# Altium footprint library My Footprint.PcbLib: 268 footprints (part 13 of 17)
Each footprint in its own frame and in the unit in brackets; x right, y up, seen from the top. Pads: shape width x height; smd on the part's side, far side on the other; paste and mask are expansions set on the pad; w line width, h text height; cw(c..) or ccw(c..) is an arc to the next point about the centre after c.
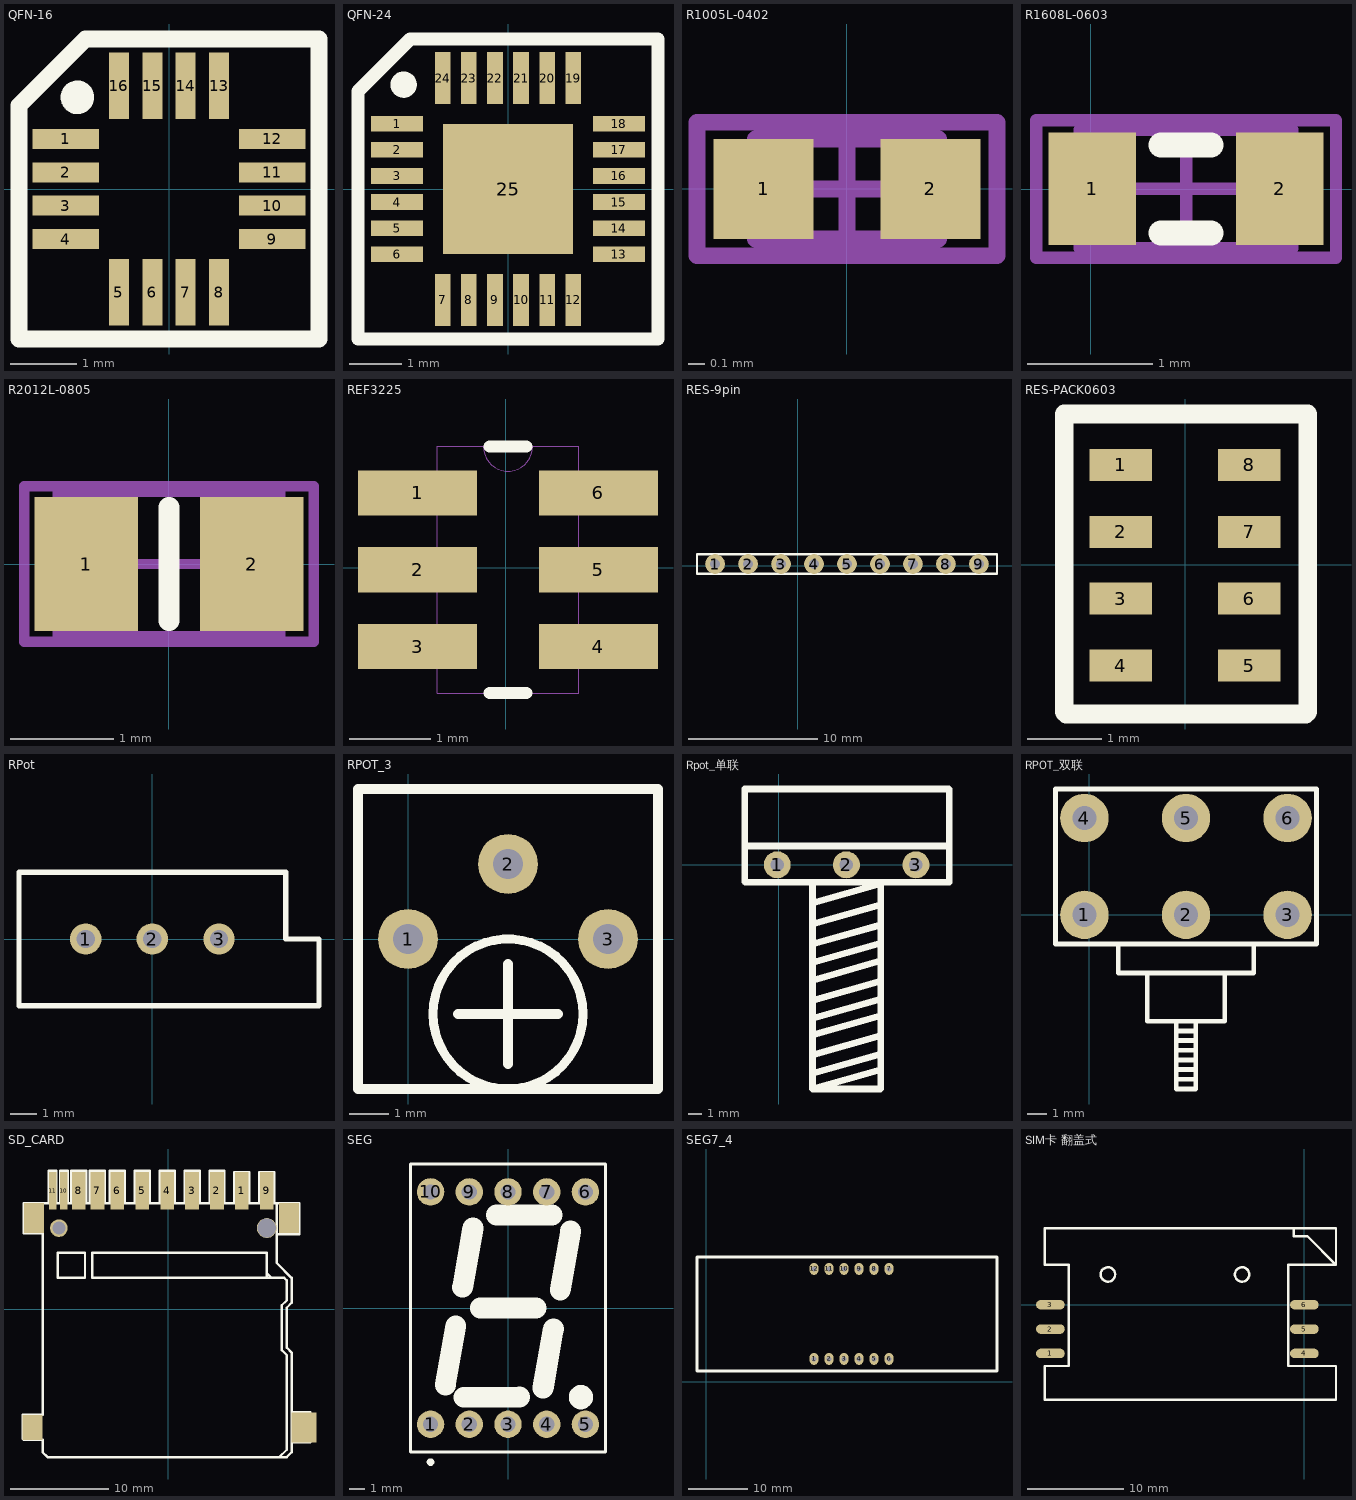
[diagram p12: the footprints below, top view; thin cyan lines are the x and y axes]

## QFN-16 [mm]
height 0.9
pads (16):
  rect 1x0.3 smd: 1(-1.55,0.75) 2(-1.55,0.25) 3(-1.55,-0.25) 4(-1.55,-0.75) 9(1.55,-0.75) 10(1.55,-0.25) 11(1.55,0.25) 12(1.55,0.75)
  rect 0.3x1 smd: 5(-0.75,-1.55) 6(-0.25,-1.55) 7(0.25,-1.55) 8(0.75,-1.55) 13(0.75,1.55) 14(0.25,1.55) 15(-0.25,1.55) 16(-0.75,1.55)
Top Overlay:
  circle w0.254: c-1.375,1.375 r0.125
  lines w0.254: -2.25,-2.25 -2.25,1.25 -1.25,2.25 2.25,2.25 2.25,-2.25 -2.25,-2.25
3D body "User Library-qfn16-3x3.step": height 0.92, standoff 0, extent -1.5,-1.5 1.5,1.5

## QFN-24 [mm]
pads (25):
  rect 1x0.3 smd: 1(-2.125,1.25) 2(-2.125,0.75) 3(-2.125,0.25) 4(-2.125,-0.25) 5(-2.125,-0.75) 6(-2.125,-1.25) 13(2.125,-1.25) 14(2.125,-0.75) 15(2.125,-0.25) 16(2.125,0.25) 17(2.125,0.75) 18(2.125,1.25)
  rect 0.3x1 smd: 7(-1.25,-2.125) 8(-0.75,-2.125) 9(-0.25,-2.125) 10(0.25,-2.125) 11(0.75,-2.125) 12(1.25,-2.125) 19(1.25,2.125) 20(0.75,2.125) 21(0.25,2.125) 22(-0.25,2.125) 23(-0.75,2.125) 24(-1.25,2.125)
  rect 2.5x2.5 smd: 25(0,0)
Top Overlay:
  circle w0.254: c-2,2 r0.125
  lines w0.254: -2.875,-2.875 2.875,-2.875 2.875,2.875 -1.25,2.875 -1.875,2.875 -2.875,1.875 -2.875,1.25 -2.875,-2.875
3D body "User Library-QFN 24 4x4.step": height 0.9, standoff 0, extent -2.002,-2.002 2.002,2.002

## R1005L-0402 [mm]
pads (2):
  rect 0.6x0.6 smd: 1(-0.5,0) 2(0.5,0)
Mechanical 13:
  lines w0.1: -0.55,-0.3 -0.55,0.3 0.55,0.3 0.55,-0.3 -0.55,-0.3
Mechanical 15:
  lines w0.1: -0.3,0 0.3,0 ; 0,-0.3 0,0.3 ; -0.9,-0.4 -0.9,0.4 0.9,0.4 0.9,-0.4 -0.9,-0.4

## R1608L-0603 [mm]
pads (2):
  rect 0.7x0.9 smd: 1(0.012,0) 2(1.512,0)
Top Overlay:
  lines w0.2: 0.562,-0.35 0.962,-0.35 ; 0.562,0.35 0.962,0.35
Mechanical 13:
  lines w0.1: -0.088,-0.475 -0.088,0.475 1.612,0.475 1.612,-0.475 -0.088,-0.475
Mechanical 15:
  lines w0.1: 0.287,0 1.237,0 ; 0.762,-0.475 0.762,0.475 ; -0.438,-0.55 -0.438,0.55 1.962,0.55 1.962,-0.55 -0.438,-0.55

## R2012L-0805 [mm]
pads (2):
  rect 1x1.3 smd: 1(-0.8,0) 2(0.8,0)
Top Overlay:
  lines w0.2: 0,-0.55 0,0.55
Mechanical 13:
  lines w0.1: -1.075,-0.7 1.075,-0.7 1.075,0.7 -1.075,0.7 -1.075,-0.7
Mechanical 15:
  lines w0.1: -0.5,0 0.5,0 ; 0,-0.5 0,0.5 ; -1.4,-0.75 1.4,-0.75 1.4,0.75 -1.4,0.75 -1.4,-0.75

## REF3225 [mil]
pads (6):
  rect 58x22 smd: 1(-43,36.4) 2(-43,-1) 3(-43,-38.4) 4(45,-38.4) 5(45,-1) 6(45,36.4)
Top Overlay:
  lines w6: -7.91,-61 9.91,-61 ; -7.91,59 9.91,59
Mechanical 1:
  lines w0: -11,59 ccw(c1,59) 13,59 ; -58,-48.4 -33.5,-48.4 -33.5,-28.4 -58,-28.4 -58,-48.4 ; -58,-11 -33.5,-11 -33.5,9 -58,9 -58,-11 ; -58,26.4 -33.5,26.4 -33.5,46.4 -58,46.4 -58,26.4 ; -33.5,-61 -33.5,59 35.5,59 35.5,-61 -33.5,-61 ; 35.5,-48.4 60,-48.4 60,-28.4 35.5,-28.4 35.5,-48.4 ; 35.5,-11 60,-11 60,9 35.5,9 35.5,-11 ; 35.5,26.4 60,26.4 60,46.4 35.5,46.4 35.5,26.4
3D body "DBV0006A.stp": height 43, standoff -1, extent -54,-58.5 58,56.51

## RES-9pin [mil]
pads (9):
  round 60 hole 30: 1(-250,5) 2(-150,5) 3(-50,5) 4(50,5) 5(150,5) 6(250,5) 7(350,5) 8(450,5) 9(550,5)
Top Overlay:
  lines w7: -305,-25 -305,35 605,35 605,-25 -305,-25
3D body "Resistor array 9pin.step": height 194.29, standoff -140.35, extent -292.91,-20 592.92,29.21

## RES-PACK0603 [mil]
pads (8):
  rect 33.19x17 smd: 1(-34.09,53) 2(-34.09,17.57) 3(-34.09,-17.87) 4(-34.09,-53.3) 5(34.09,-53.3) 6(34.09,-17.87) 7(34.09,17.57) 8(34.09,53)
Top Overlay:
  lines w10: 64,80 -64,80 -64,-78 -63,-79 64,-79 65,-78 65,80

## RPot [mm] "Potentiometer; 3 Leads"
pads (3):
  round 1.2 hole 0.7: 1(-2.54,0) 2(0,0) 3(2.54,0)
Top Overlay:
  lines w0.2: -5.08,-2.54 -5.08,2.54 5.08,2.54 5.08,0 6.35,0 6.35,-2.54 -5.08,-2.54
3D body "CERMET TRIMMER SINGLE TURN 10MM 500MW SIDE ADJUST 3386W.step": height 9.53, standoff -5, extent -4.765,-2.413 4.765,2.417

## RPOT_3 [mil]
pads (3):
  round 60 hole 30: 1(0,0) 2(100,75) 3(200,0)
Top Overlay:
  circle w9: c100,-75 r75
  lines w10: 50,-75 150,-75 ; 100,-125 100,-25 ; -50,-150 -50,0 -50,150 250,150 250,-150 -50,-150
3D body "CERMET TRIMMER SINGLE TURN 10MM 500MW TOP ADJUST.step": height 210, standoff -177.01, extent -87.6,-195 287.6,180.2

## Rpot_单联 [mm]
pads (3):
  round 2 hole 1: 1(-0.127,0) 2(5,0) 3(10.16,0)
Top Overlay:
  lines w0.5: -2.47,1.4 12.51,1.4 ; 2.53,-15.46 7.507,-14.048 ; 2.53,-11.39 7.507,-9.978 ; 2.535,-16.617 7.53,-15.2 ; 2.535,-12.617 7.53,-11.2 ; 2.535,-8.547 7.53,-7.13 ; 2.546,-14.106 7.512,-12.697 ; 2.546,-10.036 7.512,-8.627 ; 2.55,-7.23 7.527,-5.818 ; 2.555,-4.387 7.55,-2.97 ; 2.563,-2.804 7.52,-1.397 ; 2.566,-5.876 7.532,-4.467 ; 7.52,-16.63 2.51,-16.63 2.49,-16.61 2.49,-1.32 2.52,-1.29 7.55,-1.29 7.55,-16.6 ; 12.59,5.62 -2.54,5.62 -2.54,-1.26 -2.51,-1.29 12.61,-1.29 ; 12.63,-1.28 12.63,5.61

## RPOT_双联 [mil]
pads (6):
  round 100 hole 50: 1(-10,0) 2(200,0) 3(410,0) 4(-10,200) 5(200,200) 6(410,200)
Top Overlay:
  lines w10: 60,-60 60,-120 340,-120 340,-60 ; 120,-120 120,-220 280,-220 280,-120 ; 180,-340 220,-340 ; 180,-320 220,-320 ; 180,-300 220,-300 ; 180,-280 220,-280 ; 180,-260 220,-260 ; 180,-240 220,-240 ; 180,-220 180,-360 220,-360 220,-220 ; -70,-60 470,-60 470,260 -70,260 -70,-60

## SD_CARD [mil]
pads (17):
  rect 55x150 smd: 1(295.19,475.42) 2(195.19,475.42) 3(95.19,475.42) 4(-4.81,475.42) 5(-104.81,475.42) 6(-204.81,475.42) 7(-284.81,475.42) 8(-359.81,475.42) 9(395.19,475.42)
  rect 30x150 smd: 10(-419.81,475.42) 11(-464.81,475.42)
  rect 80x100 smd: ""(-544.81,-474.58)
  rect 80x120 smd: ""(-539.81,365.42) ""(485.19,365.42)
  round 70.87 hole 52: ""(-439.81,325.42)
  round 80 hole 75: ""(395.19,325.42)
  rect 100x120 smd: ""(544.81,-475.42)
Top Overlay:
  lines w10: -479.81,425.42 -479.81,555.42 -449.81,555.42 -449.81,425.42 -504.81,425.42 -579.81,425.42 -579.81,305.42 -504.81,305.42 -504.81,-424.58 -584.81,-424.58 -584.81,-519.58 -579.81,-524.58 -504.81,-524.58 -504.81,-574.58 -484.81,-594.58 -474.81,-594.58 475.19,-594.58 495.19,-574.58 495.19,-174.58 475.19,-154.58 475.19,5.42 495.19,25.42 495.19,35.42 495.19,105.42 495.19,125.42 435.19,185.42 435.19,415.42 435.19,425.42 ; -454.81,425.42 435.19,425.42 ; -434.81,425.42 -434.81,555.42 -404.81,555.42 -404.81,425.42 ; -389.81,430.42 -389.81,555.42 -329.81,555.42 -329.81,430.42 ; -354.81,125.42 -334.81,125.42 -334.81,225.42 -444.81,225.42 -444.81,125.42 -344.81,125.42 ; -314.81,430.42 -314.81,555.42 -254.81,555.42 -254.81,430.42 ; -234.81,430.42 -234.81,555.42 -174.81,555.42 -174.81,430.42 ; -134.81,430.42 -134.81,555.42 -74.81,555.42 -74.81,430.42 ; -34.81,430.42 -34.81,555.42 25.19,555.42 25.19,430.42 ; 65.19,430.42 65.19,555.42 125.19,555.42 125.19,430.42 ; 165.19,430.42 165.19,555.42 225.19,555.42 225.19,430.42 ; 265.19,425.42 265.19,550.42 325.19,550.42 325.19,425.42 ; 365.19,425.42 365.19,550.42 425.19,550.42 425.19,425.42 ; 395.19,145.42 415.19,125.42 ; 435.19,300.42 525.19,300.42 525.19,425.42 435.19,425.42 ; 445.19,-594.58 475.19,-564.58 475.19,-194.58 475.19,-184.58 455.19,-164.58 455.19,15.42 475.19,35.42 475.19,115.42 465.19,125.42 395.19,125.42 ; 495.19,-534.58 570.19,-534.58 ; 495.19,-414.58 570.19,-414.58 ; 395.19,125.42 -304.81,125.42 -304.81,225.42 395.19,225.42 395.19,135.42 395.19,125.42
3D body "SD-1.STEP": height 134.8, standoff -18.74, extent -536.38,-576.73 565,456.73

## SEG [mm] "LED, 7-Segment Display, 14.2 mm, RHD; 10 Leads; Row Space 15.24 mm; Pitch 2.54 mm"
height 8.25
pads (10):
  round 1.8 hole 1: 1(-5.08,-7.62) 2(-2.54,-7.62) 3(0,-7.62) 4(2.54,-7.62) 5(5.08,-7.62) 6(5.08,7.62) 7(2.54,7.62) 8(0,7.62) 9(-2.54,7.62) 10(-5.08,7.62)
Top Overlay:
  circle w1: c4.784,-5.842 r0.296
  circle w0.25: c-5.08,-10.1 r0.125
  lines w0.2: -6.4,-9.45 6.4,-9.45 6.4,9.45 -6.4,9.45 -6.4,-9.45
  lines w1.37: -4.108,-5.054 -3.425,-1.17 ; -2.974,1.368 -2.293,5.255 ; -2.888,-5.845 0.762,-5.842 ; -1.821,0 1.828,0 ; -0.762,6.096 2.887,6.096 ; 2.295,-5.256 2.98,-1.371 ; 3.427,1.169 4.11,5.058
3D body "7 Segment LED Module.step": height 8.38, standoff -3.12, extent -6.15,-9.5 6.15,9.5

## SEG7_4 [mil]
height 220.08
pads (12):
  oval 59.06x78.74 hole 32: 1(720,151) 2(820,151) 3(920,151) 4(1020,151) 5(1120,151) 6(1220,151) 7(1220,751) 8(1120,751) 9(1020,751) 10(920,751) 11(820,751) 12(720,751)
Top Overlay:
  lines w19.68: -60,70 -41,70 -40,71 380,71 1500,71 1920,71 1939,71 1940,70 1940,830 1939,831 1920,831 1500,831 380,831 -40,831 -59,831 -60,830 -60,70
Top Solder:
  lines w19.68: -45,70 -45,830 ; 1920,70 1920,830
3D body "SMG_4_1.step": height 314.96, standoff -137.8, extent -15.15,75.99 1965.16,824.02

## SIM卡 翻盖式 [mm]
height 2
pads (6):
  oval 3x1 smd: 1(-26.5,-5.08) 2(-26.5,-2.54) 3(-26.5,0) 4(0,-5.08) 5(0,-2.54) 6(0,0)
Top Overlay:
  circle w0.254: c-20.5,3.16 r0.75
  circle w0.254: c-6.5,3.16 r0.75
  lines w0.254: -1.1,7.96 -1.1,7.16 0.3,7.16 3.3,4.16 ; 3.3,4.16 3.3,7.96 -2.451,7.96 -27.1,7.96 -27.1,4.16 -24.6,4.16 -24.6,-6.39 -27.1,-6.39 -27.1,-9.89 3.3,-9.89 3.3,-6.39 -1.7,-6.39 -1.7,4.16 3.3,4.16
3D body "User Library-SIM5060-6-0-26-01-A.STEP": height 2.6, standoff -0.7, extent -26.48,-9.85 3.16,7.35